# Altium footprint library 5-C-THD.PcbLib: 166 footprints (part 8 of 11)
Each footprint in its own frame and in the unit in brackets; x right, y up, seen from the top. Pads: shape width x height; smd on the part's side, far side on the other; paste and mask are expansions set on the pad; w line width, h text height; cw(c..) or ccw(c..) is an arc to the next point about the centre after c.
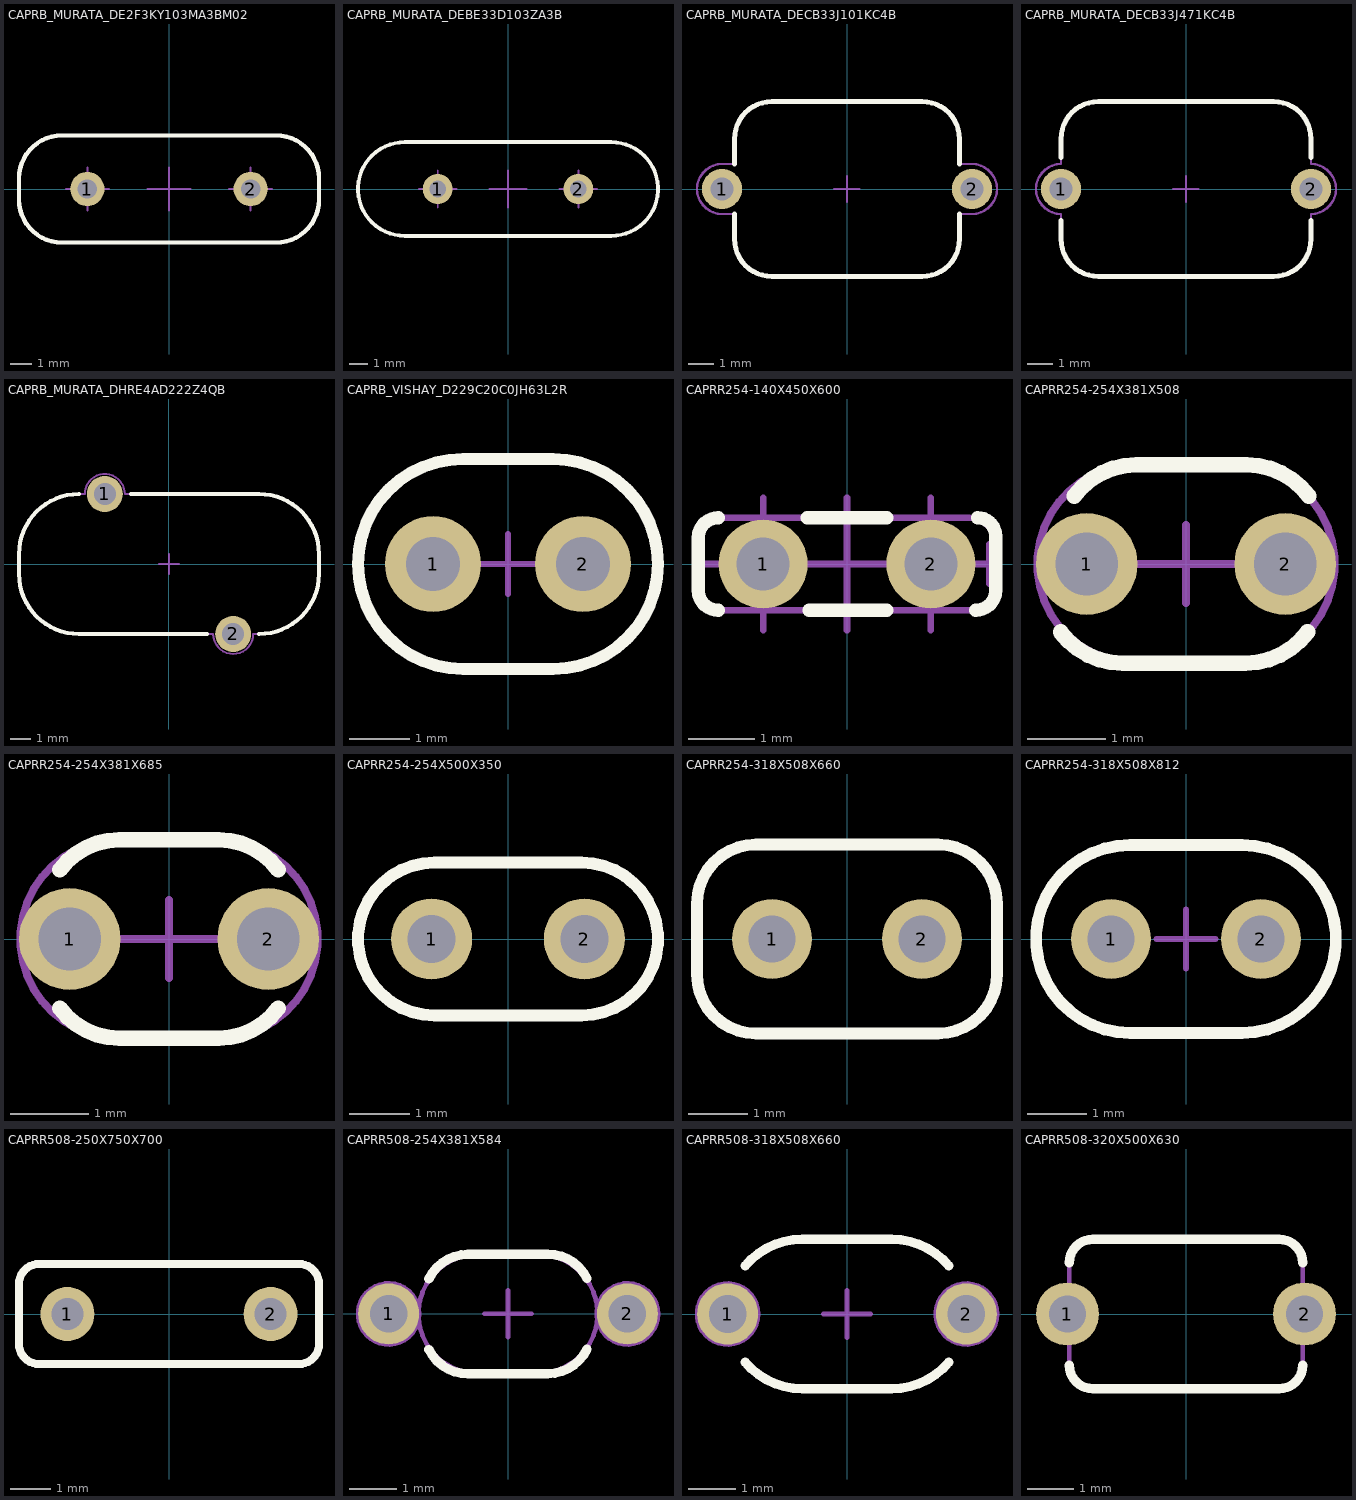
[diagram p7: the footprints below, top view; thin cyan lines are the x and y axes]

## CAPRB_MURATA_DE2F3KY103MA3BM02 [mm] "Capacitor Radial Button, Pin spacing 7.62mm - Body Diameter  14mm X Body Width 5mm X Body Height 17mm"
height 17
pads (2):
  round 1.6 hole 0.9: 1(-3.81,0) 2(3.81,0)
Top Overlay:
  lines w0.2: -7,-0.5 ccw(c-5,-0.5) -5,-2.5 5,-2.5 ccw(c5,-0.5) 7,-0.5 7,0.5 ccw(c5,0.5) 5,2.5 -5,2.5 ccw(c-5,0.5) -7,0.5 -7,-0.5
Mechanical 8:
  lines w0.1: -4.81,0 -3.81,0 ; -3.81,-1 -3.81,0 ; -3.81,1 -3.81,0 ; -2.81,0 -3.81,0 ; -1,0 0,0 ; 0,-1 0,0 ; 0,1 0,0 ; 1,0 0,0 ; 2.81,0 3.81,0 ; 3.81,-1 3.81,0 ; 3.81,1 3.81,0 ; 4.81,0 3.81,0
Mechanical 14:
  lines w0.1: -7,-0.5 ccw(c-5,-0.5) -5,-2.5 5,-2.5 ccw(c5,-0.5) 7,-0.5 7,0.5 ccw(c5,0.5) 5,2.5 -5,2.5 ccw(c-5,0.5) -7,0.5 -7,-0.5
3D body "v150-080.stp": height 0.02, standoff -1.65, extent -4.56,-0.75 -3.06,0.75
3D body "v150-080.stp": height 0.02, standoff -1.65, extent 3.06,-0.75 4.56,0.75
3D body "CAPRB_MURATA_DE2F3KY103MA3BM02.stp": height 17, standoff -3.6, extent -7,-2.5 7,2.5

## CAPRB_MURATA_DEBE33D103ZA3B [mm] "Capacitor Radial Button, Pin spacing 7.5mm - Body Diameter  16mm X Body Width 5mm X Body Height 19mm"
height 19
pads (2):
  round 1.6 hole 0.9: 1(-3.75,0) 2(3.75,0)
Top Overlay:
  lines w0.2: -5.5,-2.5 cw(c-5.5,0) -5.5,2.5 5.5,2.5 cw(c5.5,0) 5.5,-2.5 -5.5,-2.5
Mechanical 8:
  lines w0.1: -4.75,0 -3.75,0 ; -3.75,-1 -3.75,0 ; -3.75,1 -3.75,0 ; -2.75,0 -3.75,0 ; -1,0 0,0 ; 0,-1 0,0 ; 0,1 0,0 ; 1,0 0,0 ; 2.75,0 3.75,0 ; 3.75,-1 3.75,0 ; 3.75,1 3.75,0 ; 4.75,0 3.75,0
Mechanical 14:
  lines w0.1: -5.5,-2.5 cw(c-5.5,0) -5.5,2.5 5.5,2.5 cw(c5.5,0) 5.5,-2.5 -5.5,-2.5
3D body "v150-080.stp": height 0.02, standoff -1.65, extent -4.5,-0.75 -3,0.75
3D body "v150-080.stp": height 0.02, standoff -1.65, extent 3,-0.75 4.5,0.75
3D body "CAPRB_MURATA_DEBE33D103ZA3B.stp": height 19, standoff -3.8, extent -8,-2.5 8,2.5

## CAPRB_MURATA_DECB33J101KC4B [mm] "Capacitor Radial Button, Pin spacing 7.62mm - Body Diameter  9mm X Body Width 7mm X Body Height 12mm"
height 12
pads (2):
  round 1.6 hole 0.9: 1(-5,0) 2(5,0)
Top Overlay:
  lines w0.2: -4.5,-1 -4.5,-2 ccw(c-3,-2) -3,-3.5 3,-3.5 ccw(c3,-2) 4.5,-2 4.5,-1 ; -4.5,1 -4.5,2 cw(c-3,2) -3,3.5 3,3.5 cw(c3,2) 4.5,2 4.5,1
Mechanical 8:
  lines w0.1: -5.5,0 -5,0 ; -5,-0.5 -5,0 ; -5,0.5 -5,0 ; -4.5,0 -5,0 ; -0.5,0 0,0 ; 0,-0.5 0,0 ; 0,0.5 0,0 ; 0.5,0 0,0 ; 4.5,0 5,0 ; 5,-0.5 5,0 ; 5,0.5 5,0 ; 5.5,0 5,0
Mechanical 14:
  lines w0.1: -5,-1 cw(c-5,0) -5,1 -4.5,1 -4.5,2 cw(c-3,2) -3,3.5 3,3.5 cw(c3,2) 4.5,2 4.5,1 5,1 cw(c5,0) 5,-1 4.5,-1 4.5,-2 cw(c3,-2) 3,-3.5 -3,-3.5 cw(c-3,-2) -4.5,-2 -4.5,-1 -5,-1
3D body "v150-080.stp": height 0.02, standoff -1.65, extent -5.75,-0.75 -4.25,0.75
3D body "v150-080.stp": height 0.02, standoff -1.65, extent 4.25,-0.75 5.75,0.75
3D body "CAPRB_MURATA_DECB33J101KC4B.stp": height 12, standoff -3.6, extent -6,-3.5 6,3.5

## CAPRB_MURATA_DECB33J471KC4B [mm] "Capacitor Radial Button, Pin spacing 7.62mm - Body Diameter  10mm X Body Width 7mm X Body Height 12mm"
height 12
pads (2):
  round 1.6 hole 0.9: 1(-5,0) 2(5,0)
Top Overlay:
  lines w0.2: -5,-1.27 -5,-2 ccw(c-3.5,-2) -3.5,-3.5 3.5,-3.5 ccw(c3.5,-2) 5,-2 5,-1.27 ; -5,1.27 -5,2 cw(c-3.5,2) -3.5,3.5 3.5,3.5 cw(c3.5,2) 5,2 5,1.27
Mechanical 8:
  lines w0.1: -5.5,0 -5,0 ; -5,-0.5 -5,0 ; -5,0.5 -5,0 ; -4.5,0 -5,0 ; -0.5,0 0,0 ; 0,-0.5 0,0 ; 0,0.5 0,0 ; 0.5,0 0,0 ; 4.5,0 5,0 ; 5,-0.5 5,0 ; 5,0.5 5,0 ; 5.5,0 5,0
Mechanical 14:
  lines w0.1: -5,-2 ccw(c-3.5,-2) -3.5,-3.5 3.5,-3.5 ccw(c3.5,-2) 5,-2 5,-1 ccw(c5,0) 5,1 5,2 ccw(c3.5,2) 3.5,3.5 -3.5,3.5 ccw(c-3.5,2) -5,2 -5,1 ccw(c-5,0) -5,-1 -5,-2
3D body "v150-080.stp": height 0.02, standoff -1.65, extent -5.75,-0.75 -4.25,0.75
3D body "v150-080.stp": height 0.02, standoff -1.65, extent 4.25,-0.75 5.75,0.75
3D body "CAPRB_MURATA_DECB33J471KC4B.stp": height 13, standoff -3.6, extent -6,-3.5 6,3.5

## CAPRB_MURATA_DHRE4AD222Z4QB [mm] "Capacitor Radial Button, Pin spacing 9.5mm - Body Diameter  15mm X Body Width 7mm X Body Height 20mm"
height 20
pads (2):
  round 1.8 hole 1.1: 1(-3.211,3.5) 2(3.211,-3.5)
Top Overlay:
  lines w0.2: -4.511,3.5 ccw(c-4.5,0.5) -7.5,0.5 -7.5,-0.5 ccw(c-4.5,-0.5) -4.5,-3.5 1.911,-3.5 ; -1.911,3.5 4.5,3.5 cw(c4.5,0.5) 7.5,0.5 7.5,-0.5 cw(c4.5,-0.5) 4.511,-3.5
Mechanical 8:
  lines w0.1: -3.711,3.5 -3.211,3.5 ; -3.211,3 -3.211,3.5 ; -3.211,4 -3.211,3.5 ; -2.711,3.5 -3.211,3.5 ; -0.5,0 0,0 ; 0,-0.5 0,0 ; 0,0.5 0,0 ; 0.5,0 0,0 ; 2.711,-3.5 3.211,-3.5 ; 3.211,-4 3.211,-3.5 ; 3.211,-3 3.211,-3.5 ; 3.711,-3.5 3.211,-3.5
Mechanical 14:
  lines w0.1: -7.5,-0.5 ccw(c-4.5,-0.5) -4.5,-3.5 2.211,-3.5 ccw(c3.211,-3.5) 4.211,-3.5 4.5,-3.5 ccw(c4.5,-0.5) 7.5,-0.5 7.5,0.5 ccw(c4.5,0.5) 4.5,3.5 -2.211,3.5 ccw(c-3.211,3.5) -4.211,3.5 -4.5,3.5 ccw(c-4.5,0.5) -7.5,0.5 -7.5,-0.5
3D body "v150-080.stp": height 0.02, standoff -1.65, extent -3.961,2.75 -2.461,4.25
3D body "v150-080.stp": height 0.02, standoff -1.65, extent 2.462,-4.25 3.961,-2.75
3D body "CAPRB_MURATA_DHRE4AD222Z4QB.stp": height 19, standoff -3.6, extent -7.5,-4.5 7.5,4.5

## CAPRB_VISHAY_D229C20C0JH63L2R [mm] "Capacitor Radial Button, Pin spacing 2.5mm - Body Diameter  5mm X Body Width 3.5mm X Body Height 6.5mm"
height 6.5
pads (2):
  round 1.6 hole 0.9: 1(-1.25,0) 2(1.25,0)
Top Overlay:
  lines w0.2: -0.75,-1.75 cw(c-0.75,0) -0.75,1.75 0.75,1.75 cw(c0.75,0) 0.75,-1.75 -0.75,-1.75
Mechanical 8:
  lines w0.1: -1.75,0 -1.25,0 ; -1.25,-0.5 -1.25,0 ; -1.25,0.5 -1.25,0 ; -0.75,0 -1.25,0 ; -0.5,0 0,0 ; 0,-0.5 0,0 ; 0,0.5 0,0 ; 0.5,0 0,0 ; 0.75,0 1.25,0 ; 1.25,-0.5 1.25,0 ; 1.25,0.5 1.25,0 ; 1.75,0 1.25,0
Mechanical 14:
  lines w0.1: -0.75,-1.75 cw(c-0.75,0) -0.75,1.75 0.75,1.75 cw(c0.75,0) 0.75,-1.75 -0.75,-1.75
3D body "v150-080.stp": height 0.02, standoff -1.65, extent -2,-0.75 -0.5,0.75
3D body "v150-080.stp": height 0.02, standoff -1.65, extent 0.5,-0.75 2,0.75
3D body "CAPRB_VISHAY_D229C20C0JH63L2R.stp": height 6.5, standoff -3.8, extent -2.5,-1.75 2.5,1.75

## CAPRR254-140X450X600 [mm] "Capacitor Radial, Pin spacing 2.54mm - Body With 1.4mm X Body Length 4.5mm X Body Height 6mm"
height 6
pads (2):
  round 1.35 hole 0.8: 1(-1.27,0) 2(1.27,0)
Top Overlay:
  lines w0.2: -1.95,-0.7 cw(c-1.95,-0.4) -2.25,-0.4 -2.25,0.4 cw(c-1.95,0.4) -1.95,0.7 ; -0.6,0.7 0.6,0.7 ; -0.575,-0.7 0.6,-0.7 ; 1.95,-0.7 ccw(c1.95,-0.4) 2.25,-0.4 2.25,0.425 ccw(c1.975,0.425) 1.975,0.7
Mechanical 8:
  lines w0.1: -2.27,0 -1.27,0 ; -1.27,-1 -1.27,0 ; -1.27,1 -1.27,0 ; -1,0 0,0 ; -0.27,0 -1.27,0 ; 0,-1 0,0 ; 0,1 0,0 ; 0.27,0 1.27,0 ; 1,0 0,0 ; 1.27,-1 1.27,0 ; 1.27,1 1.27,0 ; 2.27,0 1.27,0
Mechanical 14:
  lines w0.1: 2.15,-0.3 2.15,0.3 ; -2.25,-0.3 ccw(c-1.85,-0.3) -1.85,-0.7 1.85,-0.7 ccw(c1.85,-0.3) 2.25,-0.3 2.25,0.3 ccw(c1.85,0.3) 1.85,0.7 -1.85,0.7 ccw(c-1.85,0.3) -2.25,0.3 -2.25,-0.3
3D body "v150-080.stp": height 0.02, standoff -1.65, extent -2.02,-0.75 -0.52,0.75
3D body "v150-080.stp": height 0.02, standoff -1.65, extent 0.52,-0.75 2.02,0.75
3D body "CAPRR254-140X450X600.stp": height 6, standoff -3.8, extent -2.25,-0.7 2.25,0.7

## CAPRR254-254X381X508 [mm] "Capacitor Radial Rounded, Pin spacing 2.54mm - Body With 2.54mm X Body Length 3.81mm X Body Height 5.08mm"
height 5.08
pads (2):
  round 1.3 hole 0.8: 1(-1.27,0) 2(1.27,0)
Top Overlay:
  lines w0.2: -1.605,-0.871 ccw(c-0.81,-0.28) -0.81,-1.27 0.76,-1.27 ccw(c0.76,-0.28) 1.555,-0.871 ; -1.429,0.871 cw(c-0.635,0.28) -0.635,1.27 0.775,1.27 cw(c0.775,0.28) 1.57,0.871
Mechanical 14:
  lines w0.1: -0.635,-1.27 cw(c-0.635,0) -0.635,1.27 0.635,1.27 cw(c0.635,0) 0.635,-1.27 -0.635,-1.27
Mechanical 15:
  lines w0.1: -0.5,0 0,0 ; 0,-0.5 0,0 ; 0,0.5 0,0 ; 0.5,0 0,0 ; -0.635,0 0.635,0 -0.635,0
3D body "v150-080.stp": height 0.02, standoff -1.65, extent -2.02,-0.75 -0.52,0.75
3D body "v150-080.stp": height 0.02, standoff -1.65, extent 0.52,-0.75 2.02,0.75
3D body "CAPRR254-254X381X508.stp": height 5.08, standoff -3.1, extent -1.905,-1.27 1.905,1.27

## CAPRR254-254X381X685 [mm] "Capacitor Radial Rounded (KEMET C315), Pin spacing 2.54mm - Body With 2.54mm X Body Length 3.81mm X Body Height 6.85mm"
height 6.85
pads (2):
  round 1.3 hole 0.8: 1(-1.27,0) 2(1.27,0)
Top Overlay:
  lines w0.2: -1.397,-0.887 ccw(c-0.635,-0.319) -0.635,-1.27 0.635,-1.27 ccw(c0.635,-0.319) 1.397,-0.887 ; -1.397,0.887 cw(c-0.635,0.319) -0.635,1.27 0.635,1.27 cw(c0.635,0.319) 1.397,0.887
Mechanical 8:
  lines w0.1: -1.77,0 -1.27,0 ; -1.27,-0.5 -1.27,0 ; -1.27,0.5 -1.27,0 ; -0.77,0 -1.27,0 ; 0.77,0 1.27,0 ; 1.27,-0.5 1.27,0 ; 1.27,0.5 1.27,0 ; 1.77,0 1.27,0
Mechanical 14:
  lines w0.1: -0.635,-1.27 cw(c-0.635,0) -0.635,1.27 0.635,1.27 cw(c0.635,0) 0.635,-1.27 -0.635,-1.27
Mechanical 15:
  lines w0.1: -0.5,0 0,0 ; 0,-0.5 0,0 ; 0,0.5 0,0 ; 0.5,0 0,0 ; -0.635,0 0.635,0 -0.635,0
3D body "v150-080.stp": height 0.02, standoff -1.65, extent -2.02,-0.75 -0.52,0.75
3D body "v150-080.stp": height 0.02, standoff -1.65, extent 0.52,-0.75 2.02,0.75
3D body "CAPRR254-254X381X685.stp": height 6.85, standoff -3.1, extent -1.905,-1.27 1.905,1.27

## CAPRR254-254X500X350 [mm] "Capacitor Radial, Pin spacing 2.54mm - Body With 2.54mm X Body Length 5.00mm X Body Height 3.5mm"
height 3.5
pads (2):
  round 1.35 hole 0.8: 1(-1.27,0) 2(1.27,0)
Top Overlay:
  lines w0.2: -1.225,-1.27 cw(c-1.225,0) -1.225,1.27 1.225,1.27 cw(c1.225,0) 1.225,-1.27 -1.225,-1.27
Mechanical 14:
  lines w0.1: -1.225,-1.27 cw(c-1.225,0) -1.225,1.27 1.225,1.27 cw(c1.225,0) 1.225,-1.27 -1.225,-1.27
3D body "v150-080.stp": height 0.02, standoff -1.65, extent -2.02,-0.75 -0.52,0.75
3D body "v150-080.stp": height 0.02, standoff -1.65, extent 0.52,-0.75 2.02,0.75
3D body "CAPRR254-254X500X350.stp": height 5, standoff -3.6, extent -2.5,-1.27 2.5,1.27

## CAPRR254-318X508X660 [mm] "Capacitor Radial Rounded, Pin spacing 2.54mm - Body With 3.18mm X Body Length 5.08mm X Body Height 6.6mm"
height 6.6
pads (2):
  round 1.35 hole 0.8: 1(-1.27,0) 2(1.27,0)
Top Overlay:
  lines w0.2: -2.54,-0.6 ccw(c-1.54,-0.6) -1.54,-1.6 1.54,-1.6 ccw(c1.54,-0.6) 2.54,-0.6 2.54,0.6 ccw(c1.54,0.6) 1.54,1.6 -1.54,1.6 ccw(c-1.54,0.6) -2.54,0.6 -2.54,-0.6
Mechanical 13:
  lines w0.1: -2.54,-0.6 ccw(c-1.54,-0.6) -1.54,-1.6 1.54,-1.6 ccw(c1.54,-0.6) 2.54,-0.6 2.54,0.6 ccw(c1.54,0.6) 1.54,1.6 -1.54,1.6 ccw(c-1.54,0.6) -2.54,0.6 -2.54,-0.6
Mechanical 14:
  lines w0.1: -2.54,-0.6 ccw(c-1.54,-0.6) -1.54,-1.6 1.54,-1.6 ccw(c1.54,-0.6) 2.54,-0.6 2.54,0.6 ccw(c1.54,0.6) 1.54,1.6 -1.54,1.6 ccw(c-1.54,0.6) -2.54,0.6 -2.54,-0.6
3D body "v150-080.stp": height 0.02, standoff -1.65, extent -2.02,-0.75 -0.52,0.75
3D body "v150-080.stp": height 0.02, standoff -1.65, extent 0.52,-0.75 2.02,0.75
3D body "CAPRR254-318X508X660.stp": height 6.6, standoff -3.6, extent -2.54,-1.59 2.54,1.59

## CAPRR254-318X508X812 [mm] "Capacitor Radial Rounded, (KEMET C320) Pin spacing 2.54mm - Body With 3.18mm X Body Length 5.08mm X Body Height 8.12mm (6.6+1.52)"
height 8.12
pads (2):
  round 1.35 hole 0.8: 1(-1.27,0) 2(1.27,0)
Top Overlay:
  lines w0.2: -0.95,-1.59 cw(c-0.95,0) -0.95,1.59 0.95,1.59 cw(c0.95,0) 0.95,-1.59 -0.95,-1.59
Mechanical 8:
  lines w0.1: -1.27,0 -1.27,0.5 -1.27,0 ; -1.27,0 -1.27,-0.5 -1.27,0 ; -1.27,0 -0.77,0 -1.27,0 ; -1.27,0 -1.77,0 -1.27,0 ; 1.27,0 1.27,0.5 1.27,0 ; 1.27,0 1.27,-0.5 1.27,0 ; 1.27,0 1.77,0 1.27,0 ; 1.27,0 0.77,0 1.27,0
Mechanical 14:
  lines w0.1: -0.95,-1.59 cw(c-0.95,0) -0.95,1.59 0.95,1.59 cw(c0.95,0) 0.95,-1.59 -0.95,-1.59
Mechanical 15:
  lines w0.1: 0,0 -0.5,0 0,0 ; 0,0 0.5,0 0,0 ; 0,0 0,-0.5 0,0 ; 0,0 0,0.5 0,0
3D body "v150-080.stp": height 0.02, standoff -1.65, extent -2.02,-0.75 -0.52,0.75
3D body "v150-080.stp": height 0.02, standoff -1.65, extent 0.52,-0.75 2.02,0.75
3D body "CAPRR254-318X508X812.stp": height 8.12, standoff -3.2, extent -2.54,-1.59 2.54,1.59

## CAPRR508-250X750X700 [mm] "Capacitor Radial Rounded, Pin spacing 5.08mm - Body With 2.5mm X Body Length 7.5mm X Body Height 7.0mm"
height 7
pads (2):
  round 1.35 hole 0.8: 1(-2.54,0) 2(2.54,0)
Top Overlay:
  lines w0.2: -3.75,-0.75 ccw(c-3.25,-0.75) -3.25,-1.25 3.25,-1.25 ccw(c3.25,-0.75) 3.75,-0.75 3.75,0.75 ccw(c3.25,0.75) 3.25,1.25 -3.25,1.25 ccw(c-3.25,0.75) -3.75,0.75 -3.75,-0.75
Mechanical 13:
  lines w0.1: -3.75,-0.75 ccw(c-3.25,-0.75) -3.25,-1.25 3.25,-1.25 ccw(c3.25,-0.75) 3.75,-0.75 3.75,0.75 ccw(c3.25,0.75) 3.25,1.25 -3.25,1.25 ccw(c-3.25,0.75) -3.75,0.75 -3.75,-0.75
Mechanical 14:
  lines w0.1: -3.75,-0.75 ccw(c-3.25,-0.75) -3.25,-1.25 3.25,-1.25 ccw(c3.25,-0.75) 3.75,-0.75 3.75,0.75 ccw(c3.25,0.75) 3.25,1.25 -3.25,1.25 ccw(c-3.25,0.75) -3.75,0.75 -3.75,-0.75
3D body "v150-080.stp": height 0.02, standoff -1.65, extent -3.29,-0.75 -1.79,0.75
3D body "v150-080.stp": height 0.02, standoff -1.65, extent 1.79,-0.75 3.29,0.75
3D body "CAPRR508-250X750X700.stp": height 7, standoff -1.94, extent -3.75,-1.25 3.75,1.25

## CAPRR508-254X381X584 [mm] "Capacitor Radial Rounded (KEMET C317), Pin spacing 5.08mm - Body With 2.54mm X Body Length 3.81mm X Body Height 5.84mm"
height 5.84
pads (2):
  round 1.3 hole 0.8: 1(-2.54,0) 2(2.54,0)
Top Overlay:
  lines w0.2: -1.682,-0.758 ccw(c-0.85,-0.347) -0.85,-1.275 ; -1.682,0.748 cw(c-0.85,0.337) -0.85,1.265 ; -0.85,-1.27 0.848,-1.27 ccw(c0.848,-0.342) 1.68,-0.753 ; -0.85,1.27 0.848,1.27 cw(c0.848,0.342) 1.68,0.753
Mechanical 14:
  circle w0.1: c-2.54,0 r0.65
  circle w0.1: c2.54,0 r0.65
  circle w0.1: c-2.54,0 r0.65
  circle w0.1: c2.54,0 r0.65
  lines w0.1: -2.54,0 -2.54,0.5 -2.54,0 ; -2.54,0 -2.54,-0.5 -2.54,0 ; -2.54,0 -2.04,0 -2.54,0 ; -2.54,0 -3.04,0 -2.54,0 ; -0.635,1.27 ccw(c-0.635,0) -0.635,-1.27 0.635,-1.27 ccw(c0.635,0) 0.635,1.27 ; -0.635,1.27 0.635,1.27 ; -0.635,1.27 0.635,1.27 ; 2.54,0 2.54,0.5 2.54,0 ; 2.54,0 3.04,0 2.54,0 ; 2.54,0 2.04,0 2.54,0 ; 2.54,0 2.54,-0.5 2.54,0
Mechanical 15:
  lines w0.1: -0.5,0 0,0 ; 0,-0.5 0,0 ; 0,0.5 0,0 ; 0.5,0 0,0
3D body "v150-080.stp": height 0.02, standoff -1.65, extent -3.29,-0.75 -1.79,0.75
3D body "v150-080.stp": height 0.02, standoff -1.65, extent 1.79,-0.75 3.29,0.75
3D body "CAPRR508-254X381X584.stp": height 5.84, standoff -1.94, extent -2.79,-1.27 2.79,1.27

## CAPRR508-318X508X660 [mm] "Capacitor Radial Rounded (KEMET C322), Pin spacing 5.08mm - Body With 3.18mm X Body Length 5.08mm X Body Height 6.6mm"
height 6.6
pads (2):
  round 1.3 hole 0.8: 1(-2.54,0) 2(2.54,0)
Top Overlay:
  lines w0.2: -2.164,-1.027 ccw(c-0.95,0) -0.95,-1.59 0.95,-1.59 ccw(c0.95,0) 2.164,-1.027 ; -2.164,1.027 cw(c-0.95,0) -0.95,1.59 0.95,1.59 cw(c0.95,0) 2.164,1.027
Mechanical 8:
  circle w0.1: c-2.54,0 r0.65
  circle w0.1: c2.54,0 r0.65
  circle w0.1: c2.54,0 r0.65
  circle w0.1: c-2.54,0 r0.65
  circle w0.1: c2.54,0 r0.65
  circle w0.1: c-2.54,0 r0.65
  lines w0.1: -3.04,0 -2.54,0 ; -3.04,0 -2.54,0 ; -3.04,0 -2.54,0 ; -2.54,-0.5 -2.54,0 ; -2.54,-0.5 -2.54,0 ; -2.54,-0.5 -2.54,0 ; -2.54,0 -2.54,0.5 ; -2.54,0 -2.04,0 ; -2.54,0 -2.04,0 ; -2.54,0 -2.54,0.5 ; -2.54,0 -2.04,0 ; -2.54,0 -2.54,0.5 ; 2.04,0 2.54,0 ; 2.04,0 2.54,0 ; 2.04,0 2.54,0 ; 2.54,-0.5 2.54,0 ; 2.54,-0.5 2.54,0 ; 2.54,-0.5 2.54,0 ; 2.54,0 2.54,0.5 ; 2.54,0 3.04,0 ; 2.54,0 3.04,0 ; 2.54,0 2.54,0.5 ; 2.54,0 3.04,0 ; 2.54,0 2.54,0.5
Mechanical 15:
  lines w0.1: -0.5,0 0,0 ; 0,-0.5 0,0 ; 0,0.5 0,0 ; 0.5,0 0,0
3D body "v150-080.stp": height 0.02, standoff -1.65, extent -3.29,-0.75 -1.79,0.75
3D body "v150-080.stp": height 0.02, standoff -1.65, extent 1.79,-0.75 3.29,0.75
3D body "CAPRR508-318X508X660.stp": height 6.6, standoff -1.94, extent -2.79,-1.59 2.79,1.59

## CAPRR508-320X500X630 [mm] "Capacitor Radial Rounded, Pin spacing 5.08mm - Body With 3.2mm X Body Length 5.0mm X Body Height 6.3mm"
height 6.3
pads (2):
  round 1.35 hole 0.8: 1(-2.54,0) 2(2.54,0)
Top Overlay:
  lines w0.2: -2.5,-1.1 ccw(c-2,-1.1) -2,-1.6 2,-1.6 ccw(c2,-1.1) 2.5,-1.1 ; -2.5,1.1 cw(c-2,1.1) -2,1.6 2,1.6 cw(c2,1.1) 2.5,1.1
Mechanical 13:
  lines w0.1: -2.5,-1.1 ccw(c-2,-1.1) -2,-1.6 2,-1.6 ccw(c2,-1.1) 2.5,-1.1 2.5,1.1 ccw(c2,1.1) 2,1.6 -2,1.6 ccw(c-2,1.1) -2.5,1.1 -2.5,-1.1
Mechanical 14:
  lines w0.1: -2.5,-1.1 ccw(c-2,-1.1) -2,-1.6 2,-1.6 ccw(c2,-1.1) 2.5,-1.1 2.5,1.1 ccw(c2,1.1) 2,1.6 -2,1.6 ccw(c-2,1.1) -2.5,1.1 -2.5,-1.1
3D body "v150-080.stp": height 0.02, standoff -1.65, extent -3.29,-0.75 -1.79,0.75
3D body "v150-080.stp": height 0.02, standoff -1.65, extent 1.79,-0.75 3.29,0.75
3D body "CAPRR508-320X500X630.stp": height 6.3, standoff -1.94, extent -2.79,-1.6 2.79,1.6